# Altium footprint library Библиотека посадочных мест.PcbLib: 128 footprints (part 4 of 8)
Each footprint in its own frame and in the unit in brackets; x right, y up, seen from the top. Pads: shape width x height; smd on the part's side, far side on the other; paste and mask are expansions set on the pad; w line width, h text height; cw(c..) or ccw(c..) is an arc to the next point about the centre after c.
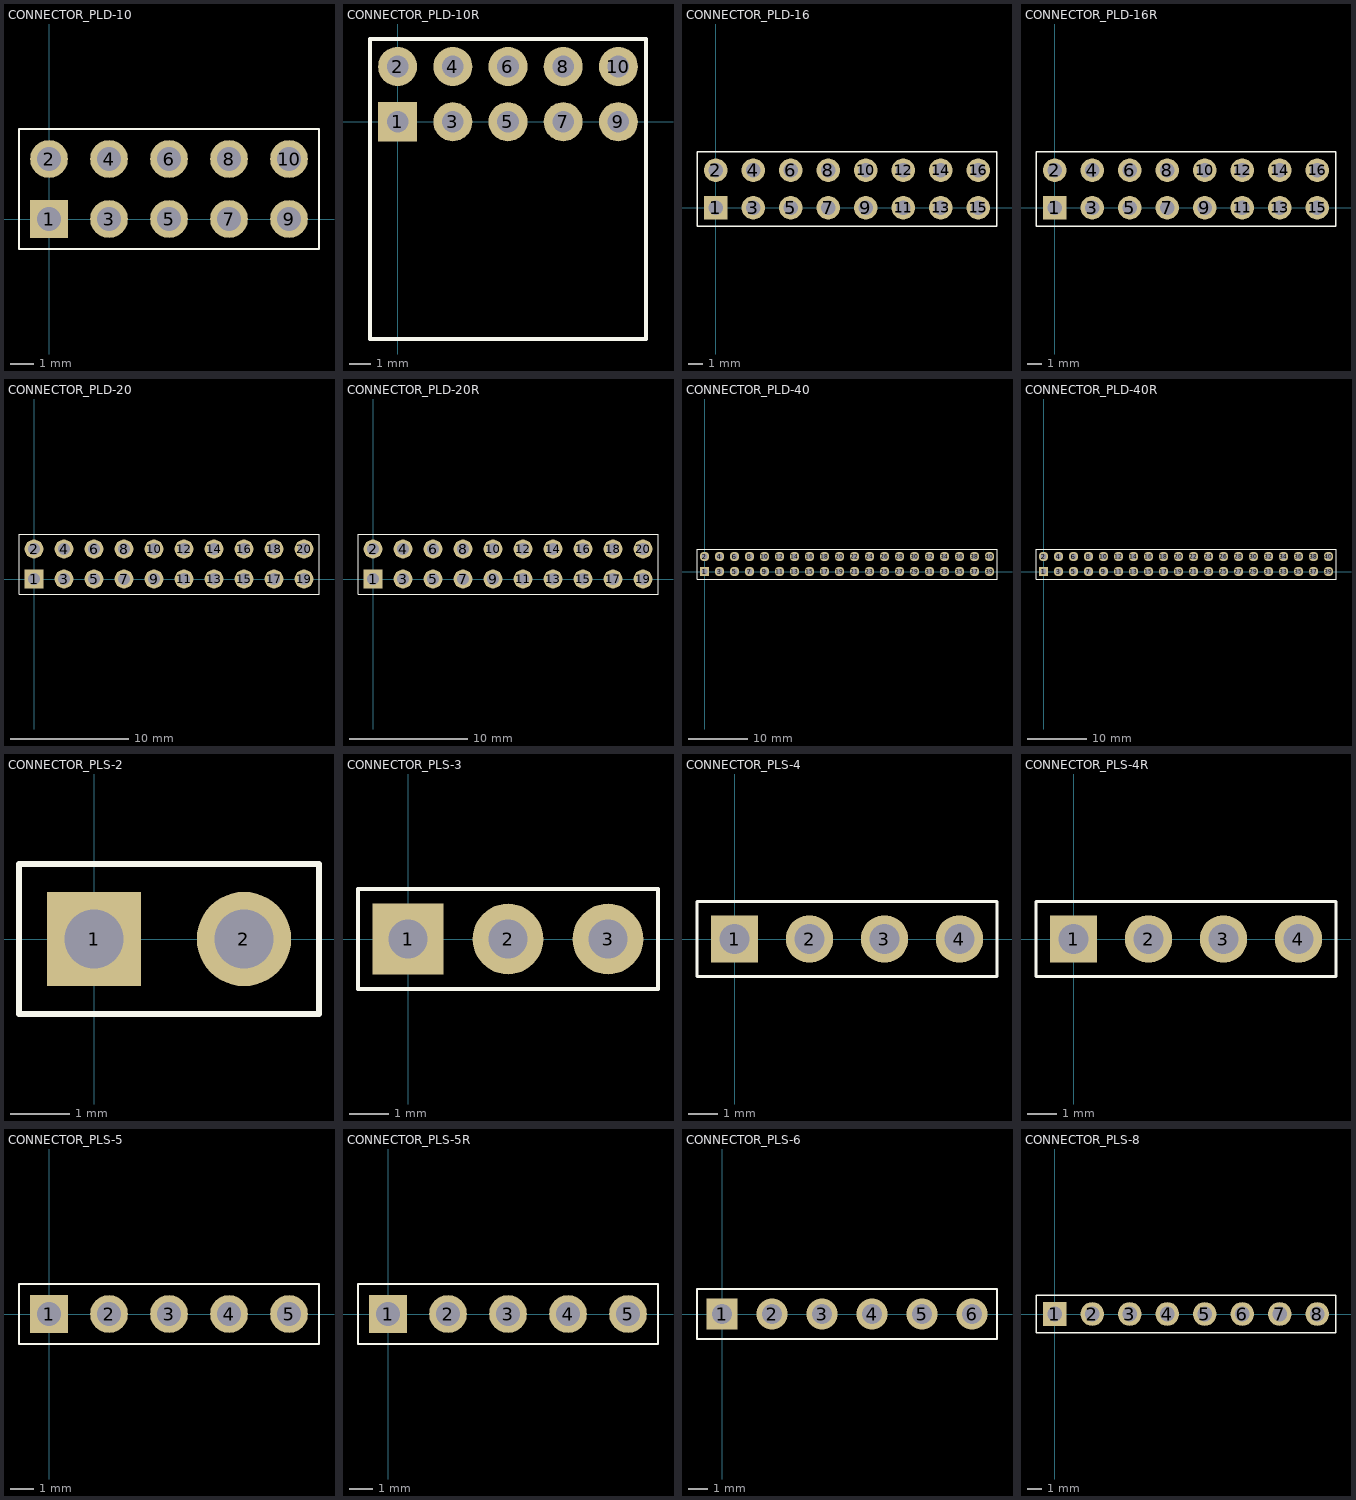
[diagram p3: the footprints below, top view; thin cyan lines are the x and y axes]

## CONNECTOR_PLD-10 [mm]
pads (10):
  rect 1.6x1.6 hole 1: 1(0,0)
  round 1.6 hole 1: 2(0,2.54) 3(2.54,0) 4(2.54,2.54) 5(5.08,0) 6(5.08,2.54) 7(7.62,0) 8(7.62,2.54) 9(10.16,0) 10(10.16,2.54)
Top Overlay:
  lines w0.1: -1.27,-1.27 3.81,-1.27 11.43,-1.27 11.43,3.81 3.81,3.81 -1.27,3.81 -1.27,1.27 -1.27,-1.27
3D body "PLD-10.STEP": height 8.8, standoff -3, extent -1.27,-1.27 11.43,3.81

## CONNECTOR_PLD-10R [mm]
pads (10):
  rect 1.8x1.8 hole 1: 1(0,0)
  round 1.8 hole 1: 2(0,2.54) 3(2.54,0) 4(2.54,2.54) 5(5.08,0) 6(5.08,2.54) 7(7.62,0) 8(7.62,2.54) 9(10.16,0) 10(10.16,2.54)
Top Overlay:
  lines w0.2: -1.27,-10 -1.27,3.81 11.43,3.81 11.43,-10 ; -1.27,-10 -1.27,-10 ; -1.27,-10 11.43,-10 ; 11.43,-10 11.43,-10
3D body "PLD-10R.STEP": height 5.08, standoff -2.6, extent -1.27,-10 11.43,2.84

## CONNECTOR_PLD-16 [mm]
pads (16):
  rect 1.6x1.6 hole 1: 1(0,0)
  round 1.6 hole 1: 2(0,2.54) 3(2.54,0) 4(2.54,2.54) 5(5.08,0) 6(5.08,2.54) 7(7.62,0) 8(7.62,2.54) 9(10.16,0) 10(10.16,2.54) 11(12.7,0) 12(12.7,2.54) 13(15.24,0) 14(15.24,2.54) 15(17.78,0) 16(17.78,2.54)
Top Overlay:
  lines w0.1: -1.27,-1.27 -1.27,1.27 -1.27,3.81 3.81,3.81 19.05,3.81 19.05,-1.27 3.81,-1.27 -1.27,-1.27
3D body "PLD-16.STEP": height 8.8, standoff -3, extent -1.27,-1.27 19.05,3.81

## CONNECTOR_PLD-16R [mm]
pads (16):
  rect 1.6x1.6 hole 1: 1(0,0)
  round 1.6 hole 1: 2(0,2.54) 3(2.54,0) 4(2.54,2.54) 5(5.08,0) 6(5.08,2.54) 7(7.62,0) 8(7.62,2.54) 9(10.16,0) 10(10.16,2.54) 11(12.7,0) 12(12.7,2.54) 13(15.24,0) 14(15.24,2.54) 15(17.78,0) 16(17.78,2.54)
Top Overlay:
  lines w0.1: -1.27,-1.27 3.81,-1.27 19.05,-1.27 19.05,3.81 3.81,3.81 -1.27,3.81 -1.27,1.27 -1.27,-1.27
3D body "PLD-16R.STEP": height 5.08, standoff -2.6, extent -1.27,-10 19.05,2.84

## CONNECTOR_PLD-20 [mm]
pads (20):
  rect 1.6x1.6 hole 1: 1(0,0)
  round 1.6 hole 1: 2(0,2.54) 3(2.54,0) 4(2.54,2.54) 5(5.08,0) 6(5.08,2.54) 7(7.62,0) 8(7.62,2.54) 9(10.16,0) 10(10.16,2.54) 11(12.7,0) 12(12.7,2.54) 13(15.24,0) 14(15.24,2.54) 15(17.78,0) 16(17.78,2.54) 17(20.32,0) 18(20.32,2.54) 19(22.86,0) 20(22.86,2.54)
Top Overlay:
  lines w0.1: -1.27,-1.27 3.81,-1.27 8.89,-1.27 13.97,-1.27 24.13,-1.27 24.13,3.81 13.97,3.81 8.89,3.81 3.81,3.81 -1.27,3.81 -1.27,1.27 -1.27,-1.27
3D body "PLD-20.STEP": height 8.8, standoff -3, extent -1.27,-1.27 24.13,3.81

## CONNECTOR_PLD-20R [mm]
pads (20):
  rect 1.6x1.6 hole 1: 1(0,0)
  round 1.6 hole 1: 2(0,2.54) 3(2.54,0) 4(2.54,2.54) 5(5.08,0) 6(5.08,2.54) 7(7.62,0) 8(7.62,2.54) 9(10.16,0) 10(10.16,2.54) 11(12.7,0) 12(12.7,2.54) 13(15.24,0) 14(15.24,2.54) 15(17.78,0) 16(17.78,2.54) 17(20.32,0) 18(20.32,2.54) 19(22.86,0) 20(22.86,2.54)
Top Overlay:
  lines w0.1: -1.27,-1.27 3.81,-1.27 8.89,-1.27 13.97,-1.27 24.13,-1.27 24.13,3.81 13.97,3.81 8.89,3.81 3.81,3.81 -1.27,3.81 -1.27,1.27 -1.27,-1.27
3D body "PLD-20R.STEP": height 5.08, standoff -2.6, extent -1.27,-10 24.13,2.84

## CONNECTOR_PLD-40 [mm]
pads (40):
  rect 1.6x1.6 hole 1: 1(0,0)
  round 1.6 hole 1: 2(0,2.54) 3(2.54,0) 4(2.54,2.54) 5(5.08,0) 6(5.08,2.54) 7(7.62,0) 8(7.62,2.54) 9(10.16,0) 10(10.16,2.54) 11(12.7,0) 12(12.7,2.54) 13(15.24,0) 14(15.24,2.54) 15(17.78,0) 16(17.78,2.54) 17(20.32,0) 18(20.32,2.54) 19(22.86,0) 20(22.86,2.54) 21(25.4,0) 22(25.4,2.54) 23(27.94,0) 24(27.94,2.54) 25(30.48,0) 26(30.48,2.54) 27(33.02,0) 28(33.02,2.54) 29(35.56,0) 30(35.56,2.54) 31(38.1,0) 32(38.1,2.54) 33(40.64,0) 34(40.64,2.54) 35(43.18,0) 36(43.18,2.54) 37(45.72,0) 38(45.72,2.54) 39(48.26,0) 40(48.26,2.54)
Top Overlay:
  lines w0.1: -1.27,-1.27 3.81,-1.27 8.89,-1.27 13.97,-1.27 49.53,-1.27 49.53,3.81 13.97,3.81 8.89,3.81 3.81,3.81 -1.27,3.81 -1.27,1.27 -1.27,-1.27
3D body "PLD-40.STEP": height 8.8, standoff -3, extent -1.27,-1.27 49.53,3.81

## CONNECTOR_PLD-40R [mm]
pads (40):
  rect 1.6x1.6 hole 1: 1(0,0)
  round 1.6 hole 1: 2(0,2.54) 3(2.54,0) 4(2.54,2.54) 5(5.08,0) 6(5.08,2.54) 7(7.62,0) 8(7.62,2.54) 9(10.16,0) 10(10.16,2.54) 11(12.7,0) 12(12.7,2.54) 13(15.24,0) 14(15.24,2.54) 15(17.78,0) 16(17.78,2.54) 17(20.32,0) 18(20.32,2.54) 19(22.86,0) 20(22.86,2.54) 21(25.4,0) 22(25.4,2.54) 23(27.94,0) 24(27.94,2.54) 25(30.48,0) 26(30.48,2.54) 27(33.02,0) 28(33.02,2.54) 29(35.56,0) 30(35.56,2.54) 31(38.1,0) 32(38.1,2.54) 33(40.64,0) 34(40.64,2.54) 35(43.18,0) 36(43.18,2.54) 37(45.72,0) 38(45.72,2.54) 39(48.26,0) 40(48.26,2.54)
Top Overlay:
  lines w0.1: -1.27,-1.27 -1.27,1.27 -1.27,3.81 3.81,3.81 8.89,3.81 13.97,3.81 49.53,3.81 49.53,-1.27 13.97,-1.27 8.89,-1.27 3.81,-1.27 -1.27,-1.27
3D body "PLD-40R.STEP": height 5.08, standoff -2.6, extent -1.27,-10 49.53,2.84

## CONNECTOR_PLS-2 [mm]
pads (2):
  rect 1.6x1.6 hole 1: 1(0,0)
  round 1.6 hole 1: 2(2.54,0)
Top Overlay:
  lines w0.1: -1.27,-1.27 3.81,-1.27 3.81,1.27 -1.27,1.27 -1.27,-1.27
3D body "PLS-2.STEP": height 8.8, standoff -3, extent -1.27,-1.27 3.81,1.27

## CONNECTOR_PLS-3 [mm]
pads (3):
  rect 1.8x1.8 hole 1: 1(0,0)
  round 1.8 hole 1: 2(2.54,0) 3(5.08,0)
Top Overlay:
  lines w0.1: -1.27,-1.27 3.81,-1.27 6.35,-1.27 6.35,1.27 3.81,1.27 -1.27,1.27 -1.27,-1.27
3D body "PLS-3.STEP": height 8.8, standoff -3, extent -1.27,-1.27 6.35,1.27

## CONNECTOR_PLS-4 [mm]
pads (4):
  rect 1.6x1.6 hole 1: 1(0,0)
  round 1.6 hole 1: 2(2.54,0) 3(5.08,0) 4(7.62,0)
Top Overlay:
  lines w0.1: -1.27,-1.27 8.89,-1.27 8.89,1.27 -1.27,1.27 -1.27,-1.27
3D body "PLS-4.STEP": height 8.8, standoff -3, extent -1.27,-1.27 8.89,1.27

## CONNECTOR_PLS-4R [mm]
pads (4):
  rect 1.6x1.6 hole 1: 1(0,0)
  round 1.6 hole 1: 2(2.54,0) 3(5.08,0) 4(7.62,0)
Top Overlay:
  lines w0.1: -1.27,-1.27 3.81,-1.27 8.89,-1.27 8.89,1.27 3.81,1.27 -1.27,1.27 -1.27,-1.27
3D body "PLS-4R gold.STEP": height 5.45, standoff -3, extent -1.27,-7.35 8.89,1.27

## CONNECTOR_PLS-5 [mm]
pads (5):
  rect 1.6x1.6 hole 1: 1(0,0)
  round 1.6 hole 1: 2(2.54,0) 3(5.08,0) 4(7.62,0) 5(10.16,0)
Top Overlay:
  lines w0.1: -1.27,-1.27 -1.27,1.27 11.43,1.27 11.43,-1.27 -1.27,-1.27
3D body "PLS-5.STEP": height 8.8, standoff -3, extent -1.27,-1.27 11.43,1.27

## CONNECTOR_PLS-5R [mm]
pads (5):
  rect 1.6x1.6 hole 1: 1(0,0)
  round 1.6 hole 1: 2(2.54,0) 3(5.08,0) 4(7.62,0) 5(10.16,0)
Top Overlay:
  lines w0.1: -1.27,-1.27 3.81,-1.27 11.43,-1.27 11.43,1.27 3.81,1.27 -1.27,1.27 -1.27,-1.27
3D body "PLS-5R.STEP": height 2.44, standoff -3.05, extent -1.27,-9.9 11.43,0.32

## CONNECTOR_PLS-6 [mm]
pads (6):
  rect 1.6x1.6 hole 1: 1(0,0)
  round 1.6 hole 1: 2(2.54,0) 3(5.08,0) 4(7.62,0) 5(10.16,0) 6(12.7,0)
Top Overlay:
  lines w0.1: -1.27,-1.27 -1.27,1.27 13.97,1.27 13.97,-1.27 -1.27,-1.27
3D body "PLS-6.STEP": height 8.8, standoff -3, extent -1.27,-1.27 13.97,1.27

## CONNECTOR_PLS-8 [mm]
pads (8):
  rect 1.6x1.6 hole 1: 1(0,0)
  round 1.6 hole 1: 2(2.54,0) 3(5.08,0) 4(7.62,0) 5(10.16,0) 6(12.7,0) 7(15.24,0) 8(17.78,0)
Top Overlay:
  lines w0.1: -1.27,-1.27 3.81,-1.27 8.89,-1.27 13.97,-1.27 19.05,-1.27 19.05,1.27 13.97,1.27 8.89,1.27 3.81,1.27 -1.27,1.27 -1.27,-1.27
3D body "PLS-8.STEP": height 8.8, standoff -3, extent -1.27,-1.27 19.05,1.27